# Altium footprint library 3D_MIG_Controller.PCBLIB: 560 footprints (part 21 of 35)
Each footprint in its own frame and in the unit in brackets; x right, y up, seen from the top. Pads: shape width x height; smd on the part's side, far side on the other; paste and mask are expansions set on the pad; w line width, h text height; cw(c..) or ccw(c..) is an arc to the next point about the centre after c.
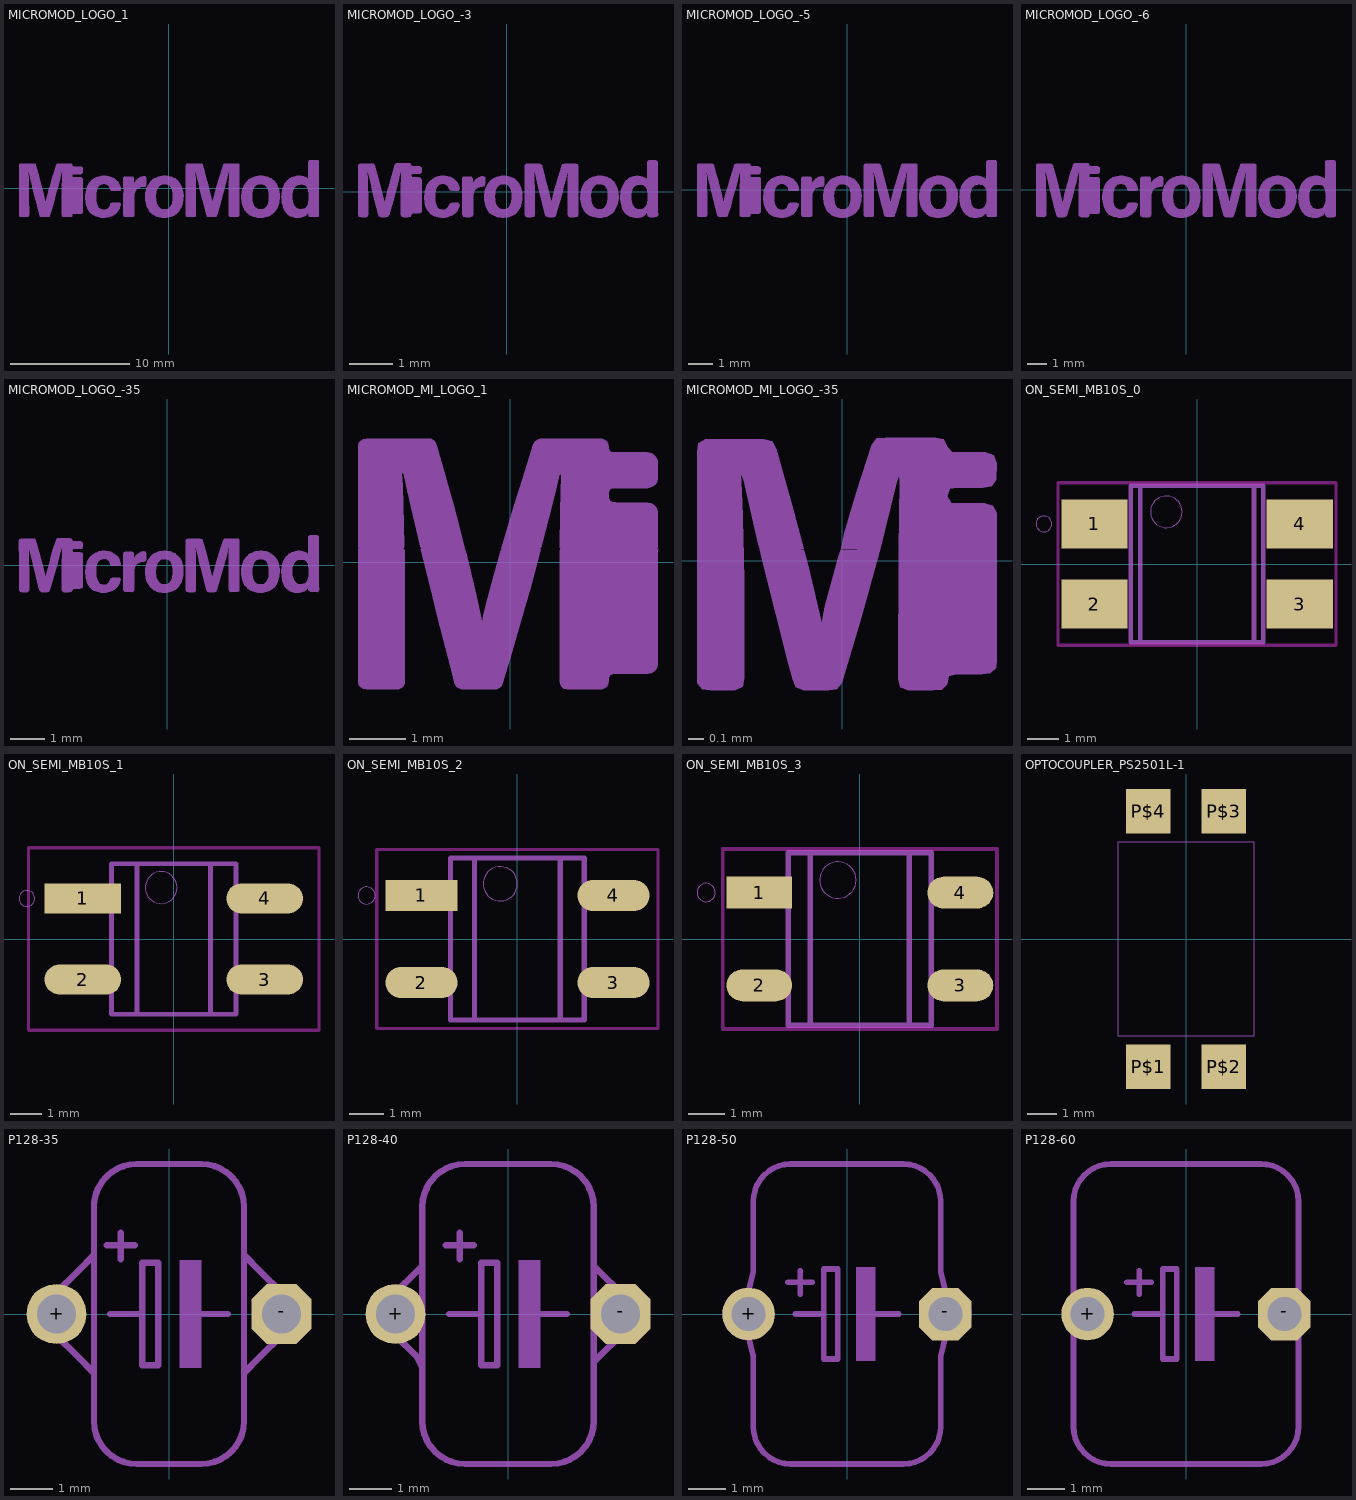
[diagram p20: the footprints below, top view; thin cyan lines are the x and y axes]

## MICROMOD_LOGO_1 [mil]
tPlace:
  drawing of 20 lines, arcs and shapes, not listed

## MICROMOD_LOGO_-3 [mil]
tPlace:
  drawing of 20 lines, arcs and shapes, not listed

## MICROMOD_LOGO_-5 [mil]
tPlace:
  drawing of 20 lines, arcs and shapes, not listed

## MICROMOD_LOGO_-6 [mil]
tPlace:
  drawing of 20 lines, arcs and shapes, not listed

## MICROMOD_LOGO_-35 [mil]
tPlace:
  drawing of 20 lines, arcs and shapes, not listed

## MICROMOD_MI_LOGO_1 [mil]
tPlace:
  drawing of 5 lines, arcs and shapes, not listed

## MICROMOD_MI_LOGO_-35 [mil]
tPlace:
  region: -35.81,2.78 -35.79,-30.22 -34.57,-31.77 -32.53,-31.94 -26.34,-31.94 -24.57,-31.04 -24.21,-29.05 -24.21,-6.36 -24.31,1.89 -25.5,2.78
  region: 38.22,2.78 15.31,2.78 14,2.98 13.91,-29.23 14.39,-31.2 16.25,-31.94 22.5,-31.94 24.58,-31.86 26,-30.46 26.4,-28.47 28.34,-28.01 34.59,-28.01 36.65,-27.79 38.07,-26.35 38.27,-24.29 38.27,0.7
  region: -0.25,2.98 7.87,2.78 9.16,1.92 12.06,13.47 13.49,19.54 14.17,21.29 14.31,19.41 14.1,11.09 13.99,2.78 36.89,2.78 38.21,2.87 38.2,11.86 37.24,13.65 35.3,14.25 26.97,14.29 26.02,15.94 26.62,17.81 28.66,18 34.91,18 36.92,18.38 38.13,20 38.22,24.16 37.43,26.03 35.55,26.8 27.23,26.81 26.02,28.22 25.14,30.01 23.14,30.38 10.65,30.38 8.59,30.23 7.3,28.69 3.57,16.77 0.54,6.82 0.14,4.99
  region: -9.41,2.78 -20.49,3.46 -19.91,1.16 -16.41,-13.07 -13.29,-25.24 -12.22,-29.29 -11.48,-31.22 -9.6,-31.94 -3.32,-31.94 -1.25,-31.77 -0.01,-30.17 4.73,-14.11 9.19,2.03 8.07,2.78 -0.3,2.78 -0.95,0.85 -3.19,-7.22 -4.21,-11.28 -5.07,-15.37 -7.82,-3.29 -8.81,0.78
  region: -33.82,30.01 -35.54,29.01 -35.82,26.97 -35.8,2.75 -34.94,2.77 -24.31,1.96 -24.37,4.71 -24.55,10.97 -24.81,17.24 -25.07,21.41 -24.26,19.93 -22.92,13.8 -20.56,3.63 -19.14,2.77 -10.78,2.77 -9.5,2.94 -12.31,13.63 -15.12,23.7 -16.3,27.71 -17.22,29.54 -19.19,30.03

## ON_SEMI_MB10S_0 [mil]
pads (4):
  rect 82.68x61.02 smd: 1(-127.95,50) 2(-127.95,-50) 3(127.95,-50) 4(127.95,50)
Top keep-out:
  lines w3.94: -173.23,-101.38 -173.23,101.38 173.23,101.38 173.23,-101.38 -173.23,-101.38
tDocu:
  lines w5.91: -82.68,-97.44 -82.68,97.44 82.68,97.44 82.68,-97.44 -82.68,-97.44
tPlace:
  circle w0: c-190.94,50 r9.84
  circle w0: c-38.39,64.96 r19.69
  lines w5.91: -70.87,-97.44 70.87,-97.44 70.87,97.44 -70.87,97.44 -70.87,-97.44

## ON_SEMI_MB10S_1 [mil]
pads (4):
  rect 94.61x37.24 smd: 1(-112.2,50)
  rrect100% 94.61x37.24 smd: 2(-112.2,-50) 3(112.2,-50) 4(112.2,50)
Top keep-out:
  lines w3.94: -179.21,-112.68 -179.21,112.68 179.21,112.68 179.21,-112.68 -179.21,-112.68
tDocu:
  lines w5.91: -76.77,-92.99 -76.77,92.99 76.77,92.99 76.77,-92.99 -76.77,-92.99
tPlace:
  circle w0: c-15.71,63.46 r19.69
  circle w0: c-181.18,50 r9.84
  lines w5.91: -45.24,-92.99 -45.24,92.99 45.24,92.99 45.24,-92.99 -45.24,-92.99

## ON_SEMI_MB10S_2 [mil]
pads (4):
  rect 82.8x35.67 smd: 1(-110.24,50)
  rrect100% 82.8x35.67 smd: 2(-110.24,-50) 3(110.24,-50) 4(110.24,50)
Top keep-out:
  lines w3.94: -161.5,-102.83 -161.5,102.83 161.5,102.83 161.5,-102.83 -161.5,-102.83
tDocu:
  lines w5.91: -76.77,-92.99 -76.77,92.99 76.77,92.99 76.77,-92.99 -76.77,-92.99
tPlace:
  circle w0: c-19.65,63.46 r19.69
  circle w0: c-173.31,50 r9.84
  lines w5.91: -49.17,-92.99 -49.17,92.99 49.17,92.99 49.17,-92.99 -49.17,-92.99

## ON_SEMI_MB10S_3 [mil]
pads (4):
  rect 70.98x34.09 smd: 1(-108.27,50)
  rrect100% 70.98x34.09 smd: 2(-108.27,-50) 3(108.27,-50) 4(108.27,50)
Top keep-out:
  lines w3.94: -147.72,-96.93 -147.72,96.93 147.72,96.93 147.72,-96.93 -147.72,-96.93
tDocu:
  lines w5.91: -76.77,-92.99 -76.77,92.99 76.77,92.99 76.77,-92.99 -76.77,-92.99
tPlace:
  circle w0: c-23.58,63.46 r19.69
  circle w0: c-165.43,50 r9.84
  lines w5.91: -53.11,-92.99 -53.11,92.99 53.11,92.99 53.11,-92.99 -53.11,-92.99

## OPTOCOUPLER_PS2501L-1 [mil]
pads (4):
  rect 59.06x59.06 smd: P$1(-50,-169.29) P$2(50,-169.29) P$3(50,169.29) P$4(-50,169.29)
tPlace:
  lines w0.39: -90.55,-127.95 90.55,-127.95 90.55,127.95 -90.55,127.95 -90.55,-127.95
  text "*" at -65,-135 h77.5

## P128-35 [mil]
pads (2):
  round 56 hole 36: +(-105,0)
  oct 56x56 / inner round 51.74 / far side oct 56x56 hole 36: -(105,0)
tDocu:
  lines w6: -85,-40 -105,-20 cw(c-105,0) -105,20 -85,40 ; -70,-25 -70,25 ; 70,-25 70,25 ; 85,-40 105,-20 ccw(c105,0) 105,20 85,40
tPlace:
  region: 10,-50 10,50 30,50 30,-50
  lines w6: -85,-40 -70,-55 ; -85,40 -70,55 ; -70,-25 -70,-55 ; -70,25 -70,55 ; -70,100 cw(c-30,100) -30,140 30,140 cw(c30,100) 70,100 70,55 ; -70,105 -70,55 ; -58,64 -32,64 ; -55,0 -25,0 ; -45,51 -45,76 ; 25,0 55,0 ; 70,-25 70,-55 ; 70,25 70,55 ; 85,-40 70,-55 ; 85,40 70,55 ; -70,-55 -70,-100 ccw(c-30,-100) -30,-140 30,-140 ccw(c30,-100) 70,-100 70,-55 ; -25,0 -25,-48 -10,-48 -10,48 -25,48 -25,0

## P128-40 [mil]
pads (2):
  round 56 hole 36: +(-105,0)
  oct 56x56 / inner round 51.74 / far side oct 56x56 hole 36: -(105,0)
tDocu:
  lines w6: -85,-40 -105,-20 cw(c-105,0) -105,20 -85,40 ; -80,-30 -80,30 ; 80,-30 80,30 ; 85,-40 105,-20 ccw(c105,0) 105,20 85,40
tPlace:
  region: 10,-50 10,50 30,50 30,-50
  lines w6: -85,-40 -80,-50 ; -85,40 -80,45 ; -80,-30 -80,-50 ; -80,30 -80,45 ; -58,64 -32,64 ; -55,0 -25,0 ; -45,51 -45,76 ; 25,0 55,0 ; 80,-30 80,-45 ; 80,30 80,45 ; 85,-40 80,-45 ; 85,40 80,45 ; -80,-50 -80,-100 ccw(c-40,-100) -40,-140 40,-140 ccw(c40,-100) 80,-100 80,-45 ; -80,45 -80,100 cw(c-40,100) -40,140 40,140 cw(c40,100) 80,100 80,45 ; -25,0 -25,-48 -10,-48 -10,48 -25,48 -25,0

## P128-50 [mil]
pads (2):
  round 56 hole 36: +(-105,0)
  oct 56x56 / inner round 51.74 / far side oct 56x56 hole 36: -(105,0)
tDocu:
  lines w6: -100,-45 -105,-25 cw(c-105,0) -105,25 -100,45 ; 100,-45 105,-25 ccw(c105,0) 105,25 100,45
tPlace:
  region: 10,-50 10,50 30,50 30,-50
  lines w6: -100,-45 -100,-120 ccw(c-60,-120) -60,-160 60,-160 ccw(c60,-120) 100,-120 100,-45 ; -100,45 -100,120 cw(c-60,120) -60,160 60,160 cw(c60,120) 100,120 100,45 ; -63,34 -37,34 ; -55,0 -25,0 ; -50,21 -50,46 ; 25,0 55,0 ; -25,0 -25,-48 -10,-48 -10,48 -25,48 -25,0

## P128-60 [mil]
pads (2):
  round 56 hole 36: +(-105,0)
  oct 56x56 / inner round 51.74 / far side oct 56x56 hole 36: -(105,0)
tDocu:
  lines w6: -120,-45 -120,45 ; 120,-45 120,45
tPlace:
  region: 10,-50 10,50 30,50 30,-50
  lines w6: -120,-45 -120,-120 ccw(c-80,-120) -80,-160 80,-160 ccw(c80,-120) 120,-120 120,-45 ; -120,45 -120,120 cw(c-80,120) -80,160 80,160 cw(c80,120) 120,120 120,45 ; -63,34 -37,34 ; -55,0 -25,0 ; -50,21 -50,46 ; 25,0 55,0 ; -25,0 -25,-48 -10,-48 -10,48 -25,48 -25,0